# Altium footprint library 二极管封装库.PcbLib: 222 footprints (part 9 of 14)
Each footprint in its own frame and in the unit in brackets; x right, y up, seen from the top. Pads: shape width x height; smd on the part's side, far side on the other; paste and mask are expansions set on the pad; w line width, h text height; cw(c..) or ccw(c..) is an arc to the next point about the centre after c.
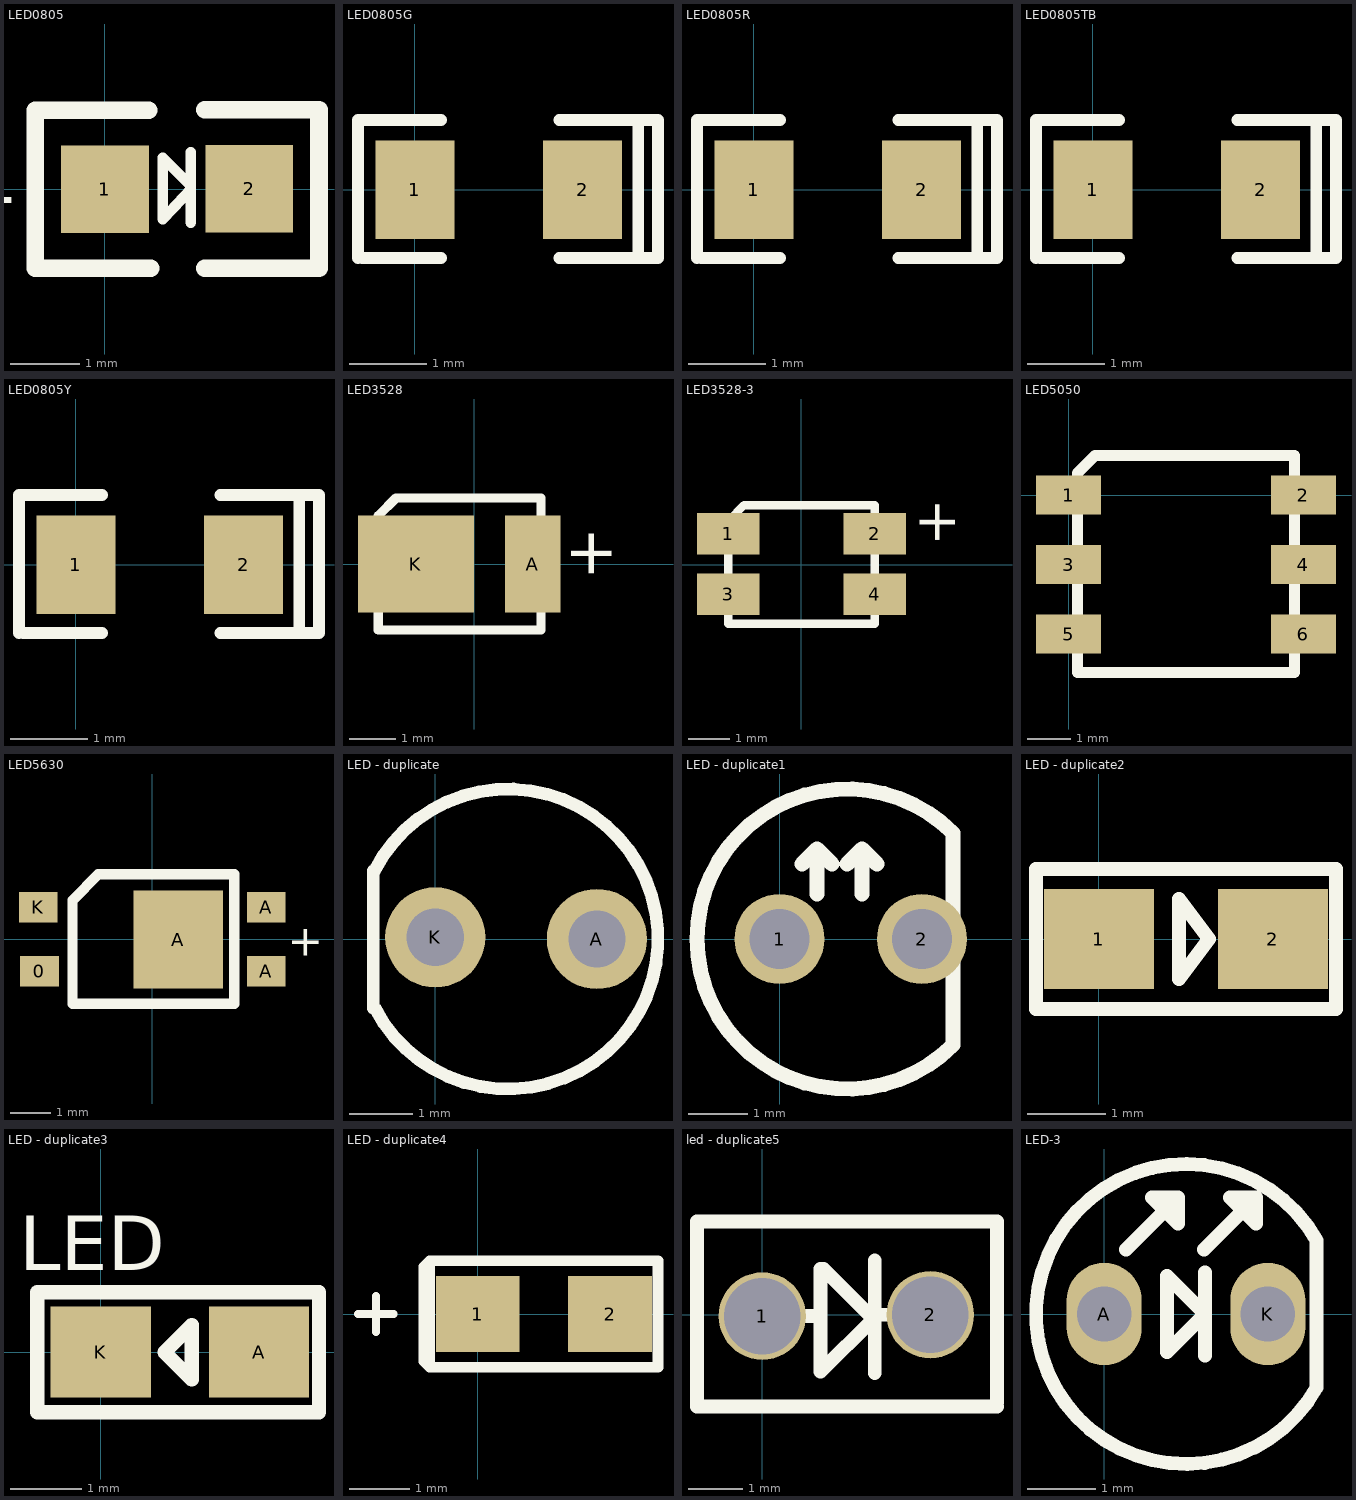
[diagram p8: the footprints below, top view; thin cyan lines are the x and y axes]

## LED0805 [mil] "1/8W"
pads (2):
  rect 50x50 smd: 1(0,0) 2(82.3,0.2)
Top Overlay:
  lines w6: 49,-19 49,21 ; 49,0 33,-17 33,18 49,2
  lines w10: 25,45 -39.8,45 -39.8,-45 26,-45 ; 57,-45 122,-45 122,45.2 57,45.2
  text "+" at -49,-19 h30
3D body: height 19.68, standoff 0, extent 2,-25 11,25
3D body: height 19.68, standoff 0, extent 71,-25 80,25
3D body: height 19.68, standoff 0, extent 11,-25 71,25
3D body: height 18, standoff 0, extent 30.48,-10 51.53,12

## LED0805G [mil]
pads (2):
  rect 40x50 smd: 1(0,0) 2(85,0)
Top Overlay:
  lines w5.98: 113.15,-34.61 123.15,-34.61 ; 113.15,35.39 123.15,35.39
  lines w6: -28.86,-34.61 -28.86,35.39 13.15,35.39 ; -26.85,-34.61 13.15,-34.61 ; 73.15,-34.61 113.15,-34.61 113.15,35.39 73.15,35.39 ; 123.15,-34.61 123.15,35.39
3D body "User Library-User Library-led_0805 GRE.STEP": height 43.31, standoff 0, extent 3.39,-24.21 82.91,25

## LED0805R [mil]
pads (2):
  rect 40x50 smd: 1(0,0) 2(85,0)
Top Overlay:
  lines w5.98: 113.15,-34.61 123.15,-34.61 ; 113.15,35.39 123.15,35.39
  lines w6: -28.86,-34.61 -28.86,35.39 13.15,35.39 ; -26.85,-34.61 13.15,-34.61 ; 73.15,-34.61 113.15,-34.61 113.15,35.39 73.15,35.39 ; 123.15,-34.61 123.15,35.39
3D body "User Library-led_0805.STEP": height 43.31, standoff 0, extent 3.39,-24.21 82.91,25

## LED0805TB [mil]
pads (2):
  rect 40x50 smd: 1(0,0) 2(85,0)
Top Overlay:
  lines w5.98: 113.15,-34.61 123.15,-34.61 ; 113.15,35.39 123.15,35.39
  lines w6: -28.86,-34.61 -28.86,35.39 13.15,35.39 ; -26.85,-34.61 13.15,-34.61 ; 73.15,-34.61 113.15,-34.61 113.15,35.39 73.15,35.39 ; 123.15,-34.61 123.15,35.39
3D body "SW3dPS-LED SMD0805.STEP": height 33.45, standoff 0.23, extent -2.07,-17.71 79.13,17.97

## LED0805Y [mil]
pads (2):
  rect 40x50 smd: 1(0,0) 2(85,0)
Top Overlay:
  lines w5.98: 113.15,-34.61 123.15,-34.61 ; 113.15,35.39 123.15,35.39
  lines w6: -28.86,-34.61 -28.86,35.39 13.15,35.39 ; -26.85,-34.61 13.15,-34.61 ; 73.15,-34.61 113.15,-34.61 113.15,35.39 73.15,35.39 ; 123.15,-34.61 123.15,35.39
3D body "User Library-User Library-led_0805 YEL.STEP": height 43.31, standoff 0, extent 3.39,-24.21 82.92,25

## LED3528 [mm]
pads (2):
  rect 1.2x2.1 smd: A(1.257,0)
  rect 2.5x2.1 smd: K(-1.257,0)
Top Overlay:
  lines w0.2: -2.07,-1.422 1.435,-1.422 1.435,1.422 -1.689,1.422 -2.07,1.041 -2.07,-1.422
  text "+" at 2.959,-0.356 h1
3D body "LED3528.step": height 1.8, standoff 0, extent -2.093,-1.4 1.407,1.4

## LED3528-3 [mil]
pads (4):
  rect 59.06x39.37 smd: 1(-69,29) 2(69,29) 3(-69,-28) 4(69,-28)
Top Overlay:
  lines w7.87: -69,-56 69,-56 69,56 -54,56 -69,41 -69,-56
  text "+" at 145,17.18 h39.37
Mechanical 2:
  text "+" at 20,-13 h39.37
3D body "LED3528.step": height 70.87, standoff 0, extent -69.89,-55.11 67.9,55.12

## LED5050 [mm]
pads (6):
  rect 1.5x0.9 smd: 1(0,0) 2(5.41,0) 3(0,-1.6) 4(5.41,-1.6) 5(0,-3.2) 6(5.41,-3.2)
Top Overlay:
  lines w0.254: 0.686,0.914 5.207,0.914 5.207,-4.089 0.203,-4.089 0.203,0.508 0.61,0.914 0.991,0.914
3D body "User Library-smd_led_5050.step": height 1.6, standoff 0, extent 0.073,-4.075 5.373,0.925

## LED5630 [mm]
pads (5):
  rect 0.95x0.75 smd: 0(-2.769,-0.781) A(2.794,-0.781) A(2.794,0.781) K(-2.794,0.781)
  rect 2.2x2.4 smd: A(0.635,-0.006)
Top Overlay:
  lines w0.254: -1.956,-1.581 2.007,-1.581 2.007,1.594 -1.321,1.594 -1.956,0.959 -1.956,-1.581
  text "+" at 3.327,-0.4 h0.76
3D body "User Library-5630.step": height 0.95, standoff -0.01, extent -2.775,-1.457 2.826,1.543

## LED - duplicate [mil]
pads (2):
  round 62 hole 35.43: A(100,0) K(0,1)
Top Overlay:
  lines w7.87: -38.34,-42.75 -38.34,42.08 ; -37.62,42.22 cw(c45,0) -37.34,-42.75

## LED - duplicate1 [mil]
pads (2):
  round 60 hole 40: 1(0,0) 2(95,0)
Top Overlay:
  lines w10: 15,50 25,60 ; 25,30 25,60 ; 35,50 25,60 ; 45,50 55,60 ; 55,30 55,60 ; 65,50 55,60 ; 115.71,-70.71 cw(c45,0) 115.71,70.71 115.71,-70.71

## LED - duplicate2 [mm]
pads (2):
  rect 1.4x1.27 smd: 1(0,0) 2(2.21,0)
Top Overlay:
  lines w0.178: 3.011,0.889 3.01,0.889 ; 3.01,0.889 -0.8,0.889 -0.8,0 -0.8,-0.889 3.01,-0.889 3.01,0.889 ; 1.016,-0.508 1.397,0 1.016,0.508 1.016,-0.508

## LED - duplicate3 [mm]
pads (2):
  rect 1.4x1.27 smd: A(2.21,0) K(0,0)
Top Overlay:
  lines w0.2: -0.889,-0.838 -0.889,0.838 0.095,0.838 2.064,0.838 3.048,0.838 3.048,-0.838 -0.889,-0.838 ; 0.889,0 1.27,0.381 1.27,-0.381 0.889,0
  text "LED" at -1.143,1.143 h0.76

## LED - duplicate4 [mm]
pads (2):
  rect 1.4x1.27 smd: 1(0,0) 2(2.21,0)
Top Overlay:
  lines w0.127: -2,0 -1.5,0 -1.4,0 ; -1.7,-0.3 -1.7,0.3
  lines w0.178: -0.901,-0.788 -0.901,0.788 -0.8,0.889 ; -0.901,-0.788 -0.8,-0.889 ; -0.901,-0.788 -0.8,-0.889 ; -0.8,-0.889 3.01,-0.889 3.01,0.889 -0.8,0.889 ; -0.8,-0.889 -0.8,0 -0.8,0.889

## led - duplicate5 [mm]
pads (2):
  round 1.6 hole 1.4: 1(0,-0.025) 2(3.073,0)
Top Overlay:
  lines w0.254: 0.61,-0.025 1.067,-0.025 ; 1.067,0.838 1.067,-1.041 2.032,-0.076 1.118,0.838 ; 2.057,-1.067 2.057,0.991 ; 2.057,0 2.388,0 ; 4.293,-1.676 -1.194,-1.676 -1.194,1.702 4.293,1.702 4.293,-1.6

## LED-3 [mm]
pads (2):
  oval 1.1x1.5 hole 0.8: A(0,0) K(2.4,0)
Top Overlay:
  lines w0.203: 0.322,0.946 1.084,1.708 ; 1.465,0.946 2.227,1.708 ; 1.479,-0.61 1.479,0.61 ; 3.116,-1.073 3.116,1.082 ccw(c1.2,0) 3.119,-1.076 ; 1.084,1.708 1.084,1.327 0.703,1.708 1.084,1.708 ; 2.227,1.708 1.846,1.708 2.227,1.327 2.227,1.708 ; 0.921,-0.559 0.921,0.559 1.479,0 0.921,-0.559